# Altium footprint library standard.PcbLib: 229 footprints (part 15 of 15)
Each footprint in its own frame and in the unit in brackets; x right, y up, seen from the top. Pads: shape width x height; smd on the part's side, far side on the other; paste and mask are expansions set on the pad; w line width, h text height; cw(c..) or ccw(c..) is an arc to the next point about the centre after c.
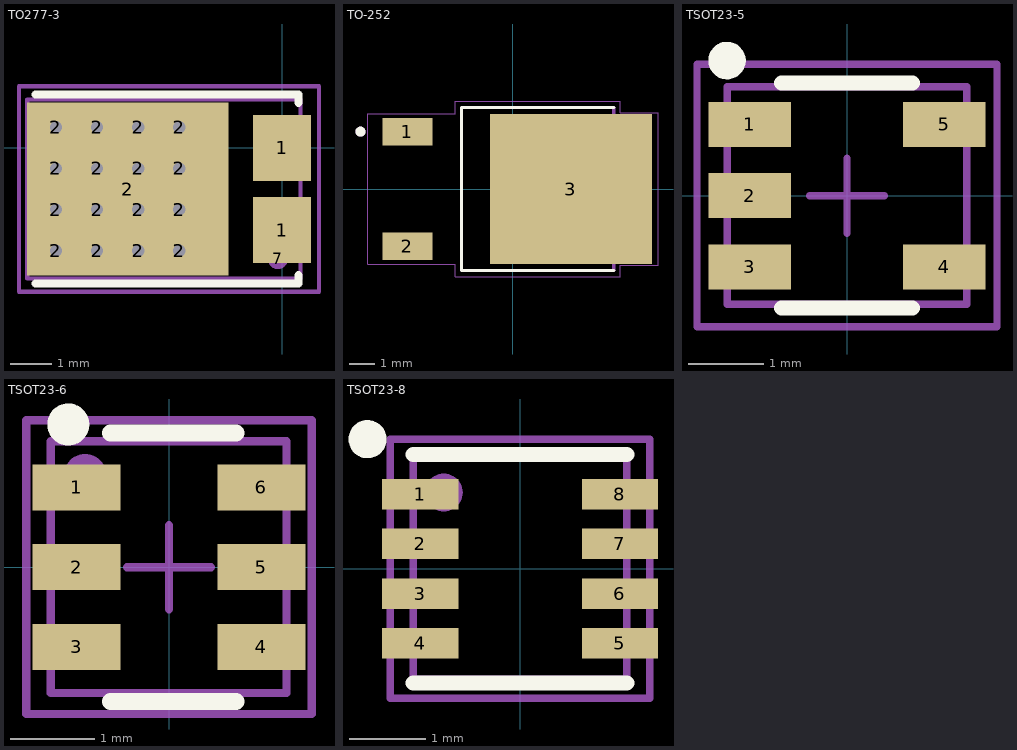
[diagram p14: the footprints below, top view; thin cyan lines are the x and y axes]

## TO277-3 [mm]
pads (20):
  rect 1.4x1.6 smd: 1(0,-2) 1(0,0)
  round 0.7 hole 0.3: 2(-5.5,-2.5) 2(-5.5,-1.5) 2(-5.5,-0.5) 2(-5.5,0.5) 2(-4.5,-2.5) 2(-4.5,-1.5) 2(-4.5,-0.5) 2(-4.5,0.5) 2(-3.5,-2.5) 2(-3.5,-1.5) 2(-3.5,-0.5) 2(-3.5,0.5) 2(-2.5,-2.5) 2(-2.5,-1.5) 2(-2.5,-0.5) 2(-2.5,0.5)
  rect 4.9x4.2 smd: 2(-3.75,-1)
  round 0.5 on Mech1: 7(-0.1,-2.7)
Top Overlay:
  lines w0.2: -6,-3.3 0.4,-3.3 0.4,-3.1 ; -6,1.3 0.4,1.3 0.4,1.1
Mechanical 1:
  lines w0.1: -6.2,1.175 0.45,1.175 0.45,-3.175 -6.2,-3.175 -6.2,1.175 ; -6.2,1.175 -6.2,1.175
Mechanical 15:
  lines w0.1: -6.4,-3.5 0.9,-3.5 0.9,1.5 -6.4,1.5 -6.4,-3.5
3D body "TO-277_3L.stp": height 1.25, standoff 0, extent -6.2,-3.175 0.45,1.175

## TO-252 [mm]
height 2.55
pads (3):
  rect 2x1.1 smd: 1(-4.225,2.285) 2(-4.225,-2.285)
  rect 6.49x6 smd paste-4: 3(2.32,0)
Top Overlay:
  circle w0.2: c-6.105,2.3 r0.1
  lines w0.127: 4.043,-3.27 -2.058,-3.27 -2.058,3.27 4.043,3.27
Top Paste:
  region: 3.035,0.555 1.605,0.555 1.605,2.265 3.035,2.265
  region: 5.205,0.555 3.775,0.555 3.775,2.265 5.205,2.265
  region: 0.865,0.555 -0.565,0.555 -0.565,2.265 0.865,2.265
  region: 0.865,-2.265 -0.565,-2.265 -0.565,-0.555 0.865,-0.555
  region: 3.035,-2.265 1.605,-2.265 1.605,-0.555 3.035,-0.555
  region: 5.205,-2.265 3.775,-2.265 3.775,-0.555 5.205,-0.555
Mechanical 13:
  circle w0.2: c-6.105,2.3 r0.1
  lines w0.127: -2.058,-3.27 -2.058,3.27 4.043,3.27 4.043,-3.27 -2.058,-3.27
Mechanical 15:
  lines w0.05: -5.815,-3.025 -5.815,3.025 -2.308,3.025 -2.308,3.52 4.293,3.52 4.293,3.065 5.815,3.065 5.815,-3.065 4.293,-3.065 4.293,-3.52 -2.308,-3.52 -2.308,-3.025 -5.815,-3.025
3D body "step_temp.STEP": height 2.55, standoff -0.17, extent -4.955,-3.27 4.955,3.27

## TSOT23-5 [mm] "TSOT23, 5-Leads, Body 2,90x2,80mm, Pitch 0,95mm"
height 1.45
pads (6):
  rect 1.1x0.6 smd: 1(-1.3,0.95) 2(-1.3,0) 3(-1.3,-0.95) 4(1.3,-0.95) 5(1.3,0.95)
  round 0.5 on Mech1: ""(-1.2,1)
Top Overlay:
  circle w0.25: c-1.6,1.8 r0.125
  lines w0.2: -0.875,-1.5 0.875,-1.5 ; -0.875,1.5 0.875,1.5
Mechanical 1:
  lines w0.1: -1.595,-1.45 -1.595,1.45 1.595,1.45 1.595,-1.45 -1.595,-1.45
Mechanical 15:
  lines w0.1: -0.5,0 0.5,0 ; 0,-0.5 0,0.5 ; -2,-1.75 -2,1.75 2,1.75 2,-1.75 -2,-1.75
3D body "TSOT23-5.STEP": height 0.94, standoff -0.02, extent -1.595,-1.45 1.595,1.45

## TSOT23-6 [mm] "TSOT23, 6-Leads, Body 2,90x1,75mm, Pitch 0,9mm"
height 1
pads (7):
  rect 1.05x0.55 smd: 1(-1.1,0.95) 2(-1.1,0) 3(-1.1,-0.95) 4(1.1,-0.95) 5(1.1,0) 6(1.1,0.95)
  round 0.5 on Mech1: ""(-1,1.1)
Top Overlay:
  circle w0.25: c-1.2,1.7 r0.125
  lines w0.2: -0.7,-1.6 0.8,-1.6 ; -0.7,1.6 0.8,1.6
Mechanical 1:
  lines w0.1: -1.41,-1.5 -1.41,1.5 1.4,1.5 1.4,-1.5 -1.41,-1.5
Mechanical 15:
  lines w0.1: -0.5,0 0.5,0 ; 0,-0.5 0,0.5 ; -1.7,-1.75 -1.7,1.75 1.7,1.75 1.7,-1.75 -1.7,-1.75
3D body "TSOT23-6.STEP": height 0.86, standoff 0, extent -1.41,-1.5 1.4,1.5

## TSOT23-8 [mm]
height 1
pads (9):
  rect 1x0.4 smd: 1(-1.31,0.975) 2(-1.31,0.325) 3(-1.31,-0.325) 4(-1.31,-0.975) 5(1.31,-0.975) 6(1.31,-0.325) 7(1.31,0.325) 8(1.31,0.975)
  round 0.5 on Mech1: ""(-1,1)
Top Overlay:
  circle w0.25: c-2,1.7 r0.125
  lines w0.2: -1.4,-1.5 1.4,-1.5 ; -1.4,1.5 1.4,1.5
Mechanical 1:
  lines w0.1: -1.4,-1.45 -1.4,1.45 1.4,1.45 1.4,-1.45 -1.4,-1.45
Mechanical 15:
  lines w0.1: -1.7,-1.7 1.7,-1.7 1.7,1.7 -1.7,1.7 -1.7,-1.7
3D body "TSOT23-8_2.STEP": height 1, standoff 0, extent -1.4,-1.45 1.4,1.45